# Altium footprint library SparkFun.PCBLIB: 674 footprints (part 30 of 44)
Each footprint in its own frame and in the unit in brackets; x right, y up, seen from the top. Pads: shape width x height; smd on the part's side, far side on the other; paste and mask are expansions set on the pad; w line width, h text height; cw(c..) or ccw(c..) is an arc to the next point about the centre after c.
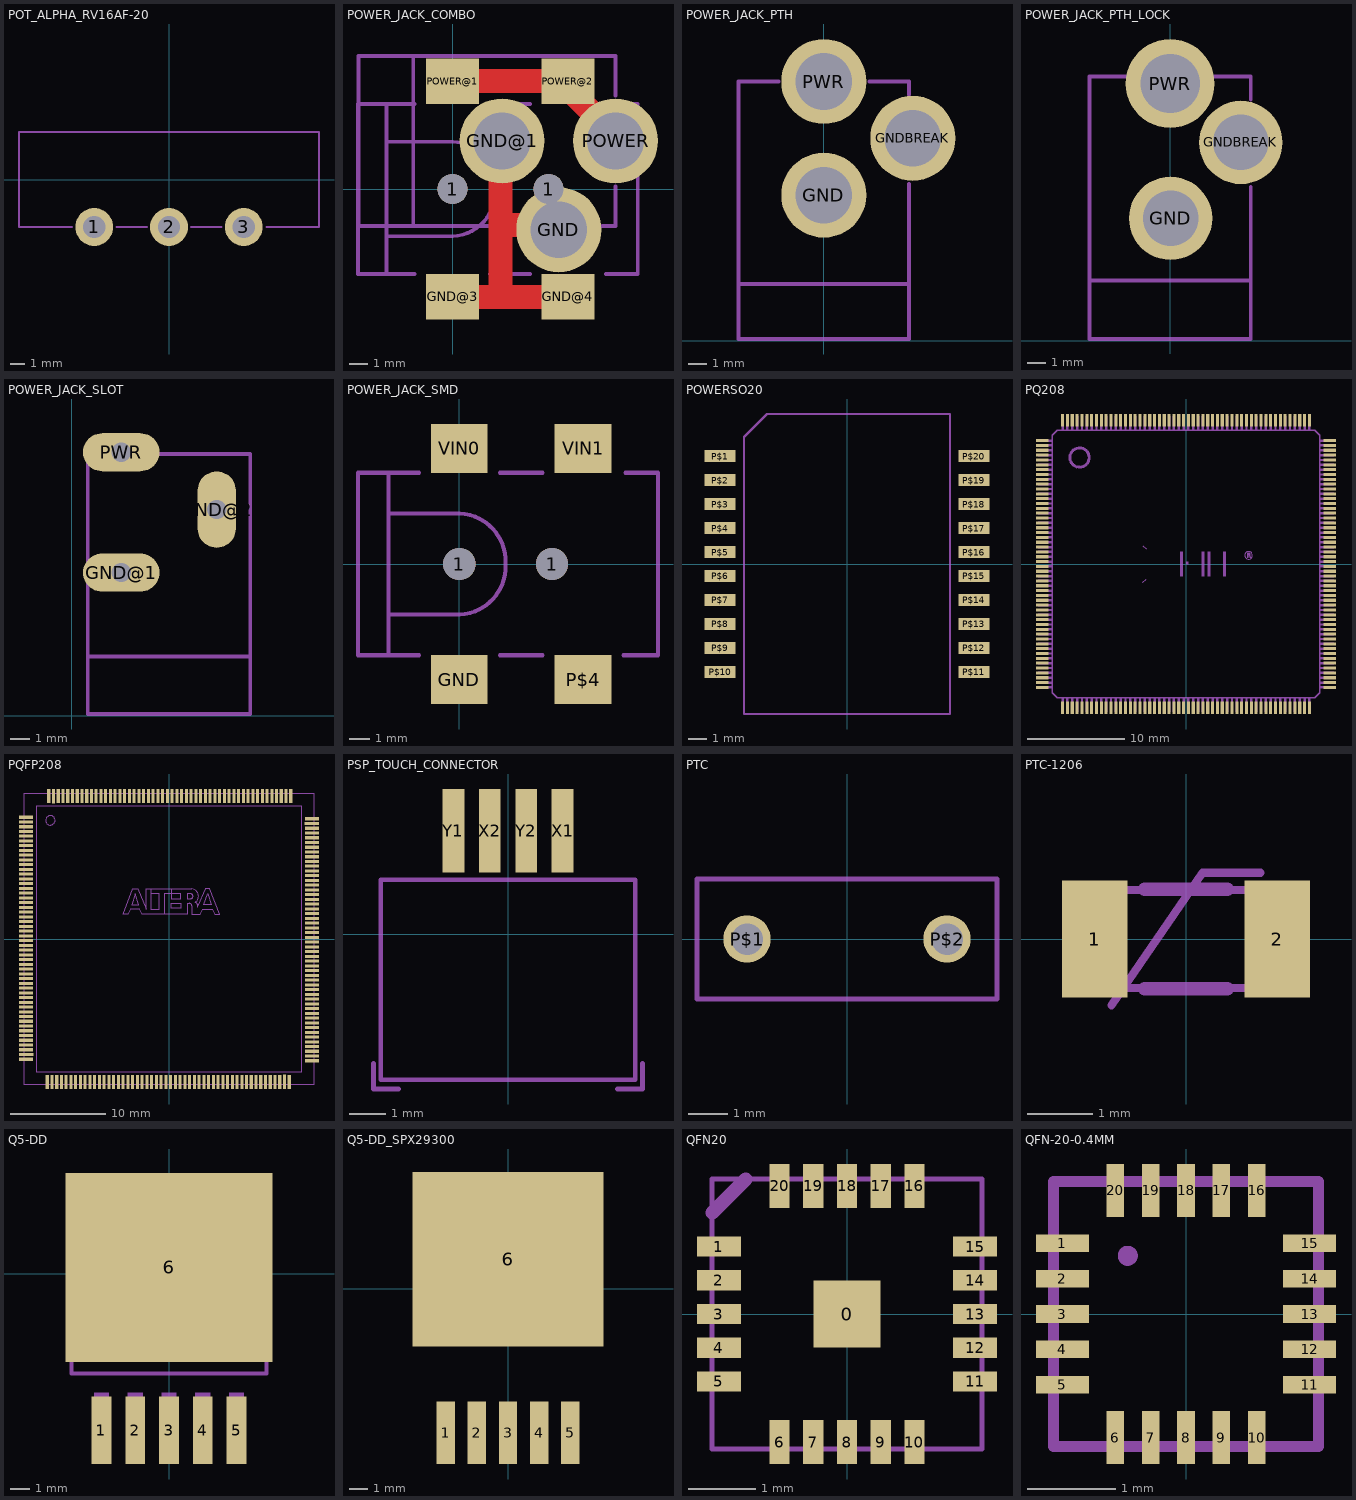
[diagram p29: the footprints below, top view; thin cyan lines are the x and y axes]

## POT_ALPHA_RV16AF-20 [mm]
pads (3):
  round 2.54 hole 1.5: 1(-5,-3.175) 2(0,-3.175) 3(5,-3.175)
Mechanical 2:
  lines w0.127: -6.477,-3.175 -10.033,-3.175 -10.033,3.175 10.033,3.175 10.033,-3.175 6.528,-3.175 ; -3.531,-3.175 -1.473,-3.175 ; 1.473,-3.175 3.531,-3.175

## POWER_JACK_COMBO [mil]
pads (9):
  round 62.99 hole 62.99: 1(0,0) 1(200,0)
  round 177 hole 118: GND(221.26,-85.04) GND@1(103.15,100) POWER(339.37,100)
  rect 110.24x94.49 smd: GND@3(0,-224.41) GND@4(240.16,-224.41) POWER@1(0,224.41) POWER@2(240.16,224.41)
Top Layer:
  lines w50: 0,-225 100,-225 ; 0,225 250,225 250,200 350,100 ; 100,100 100,-75 ; 225,-75 100,-75 ; 250,-225 100,-225 ; 100,-225 100,-75
Mechanical 18:
  lines w8: -78.74,-177.17 -137.8,-177.17 ; -78.74,177.17 -137.8,177.17 ; 78.74,-177.17 161.42,-177.17 ; 78.74,177.17 161.42,177.17 ; 126.77,-77.17 -81.89,-77.17 ; 311.81,-77.17 339.37,-77.17 339.37,5.51 ; 318.9,-177.17 385.83,-177.17 385.83,177.17 322.83,177.17 ; 339.37,194.49 339.37,277.17 -81.89,277.17 ; -137.8,-177.17 -196.85,-177.17 -196.85,177.17 -137.8,177.17 ; -137.8,-177.17 -137.8,-98.43 ; -137.8,-98.43 -137.8,98.43 ; -137.8,-98.43 0,-98.43 ccw(c-4.21,-4.21) 90,0 ccw(c-4.21,4.21) 0,98.43 -137.8,98.43 ; -137.8,98.43 -137.8,177.17 ; -81.89,-77.17 -196.06,-77.17 -196.06,277.17 -81.89,277.17 ; -81.89,-77.17 -81.89,277.17

## POWER_JACK_PTH [mil]
pads (3):
  round 177 hole 118: GND(0,303.15) GNDBREAK(185.04,421.26) PWR(0,539.37)
Mechanical 2:
  lines w8: -94.49,539.37 -177.17,539.37 -177.17,118.11 177.17,118.11 177.17,326.77 ; 94.49,539.37 177.17,539.37 177.17,511.81
Mechanical 18:
  lines w8: -177.17,118.11 -177.17,3.94 177.17,3.94 177.17,118.11

## POWER_JACK_PTH_LOCK [mil]
pads (3):
  round 177 hole 118: GND(1,260.15) GNDBREAK(150.09,421.26)
  round 188.97 hole 125.98: PWR(0,546.37)
Mechanical 2:
  lines w8: -94.49,561.37 -171.17,561.37 -171.17,128.11 171.17,128.11 171.17,326.77 ; 94.49,561.37 171.17,561.37 171.17,511.81
Mechanical 18:
  region: 58,528 58,546 -57,546 -57,528
  region: 48,291 48,302 -48,302 -48,291
  region: 187,469 176,469 176,373 187,373
  lines w8: -171.17,129.11 -171.17,3.94 171.17,3.94 171.17,129.11

## POWER_JACK_SLOT [mm]
pads (3):
  oval 4x2 hole 1: GND@1(2.58,7.5) PWR(2.58,13.8)
  oval 2x4 hole 1: GND@2(7.58,10.8)
Mechanical 2:
  lines w0.203: 0.83,6.51 0.83,3.1 9.33,3.1 ; 0.83,8.4 0.83,12.7 ; 4.83,13.7 9.33,13.7 9.33,3.1 ; 9.28,3.1 9.33,3.1
Mechanical 13:
  lines w0: 0.98,13.8 4.18,13.8 ; 0.98,13.8 cw(c1.48,13.8) 1.48,14.3 3.68,14.3 cw(c3.68,13.8) 4.18,13.8 ; 0.98,13.8 ccw(c1.48,13.8) 1.48,13.3 3.68,13.3 ccw(c3.68,13.8) 4.18,13.8 ; 0.98,7.5 cw(c1.48,7.5) 1.48,8 3.68,8 cw(c3.68,7.5) 4.18,7.5 cw(c3.68,7.5) 3.68,7 1.48,7 cw(c1.48,7.5) 0.98,7.5 ; 7.08,9.7 ccw(c7.58,9.7) 7.58,9.2 ccw(c7.58,9.7) 8.08,9.7 8.08,11.9 ccw(c7.58,11.9) 7.58,12.4 ccw(c7.58,11.9) 7.08,11.9 7.08,9.7
Mechanical 18:
  lines w0.203: 0.83,3.1 0.83,0.1 9.33,0.1 9.33,3.1 ; 0.83,6.55 0.83,8.4 ; 0.83,12.7 0.83,13.7 4.83,13.7

## POWER_JACK_SMD [mm]
pads (6):
  round 1.6 hole 1.6: 1(0,0) 1(4.572,0)
  rect 2.8x2.4 smd: GND(0,-5.7) P$4(6.1,-5.7) VIN0(0,5.7) VIN1(6.1,5.7)
Mechanical 2:
  lines w0.203: -2,-4.5 -3.5,-4.5 -3.5,-2.5 ; -2,4.5 -3.5,4.5 -3.5,2.5 ; 2,-4.5 4.1,-4.5 ; 2,4.5 4.1,4.5 ; 8.1,-4.5 9.8,-4.5 9.8,4.5 8.2,4.5 ; -3.5,-2.5 -3.5,2.5 ; -3.5,-2.5 0,-2.5 ccw(c-0.107,-0.107) 2.286,0 ccw(c-0.107,0.107) 0,2.5 -3.5,2.5
Mechanical 18:
  lines w0.203: -3.5,-4.5 -5,-4.5 -5,4.5 -3.5,4.5

## POWERSO20 [mil]
pads (20):
  rect 65x25 smd: P$1(-265,225) P$2(-265,175) P$3(-265,125) P$4(-265,75) P$5(-265,25) P$6(-265,-25) P$7(-265,-75) P$8(-265,-125) P$9(-265,-175) P$10(-265,-225) P$11(265,-225) P$12(265,-175) P$13(265,-125) P$14(265,-75) P$15(265,-25) P$16(265,25) P$17(265,75) P$18(265,125) P$19(265,175) P$20(265,225)
Mechanical 2:
  lines w5: -215,-313 215,-313 215,313 -167,313 -215,265 -215,-313

## PQ208 [mil]
pads (208):
  rect 51.18x12.6 smd paste-25.59: 1(-584.65,501.97) 2(-584.65,482.28) 3(-584.65,462.6) 4(-584.65,442.91) 5(-584.65,423.23) 6(-584.65,403.54) 7(-584.65,383.86) 8(-584.65,364.17) 9(-584.65,344.49) 10(-584.65,324.8) 11(-584.65,305.12) 12(-584.65,285.43) 13(-584.65,265.75) 14(-584.65,246.06) 15(-584.65,226.38) 16(-584.65,206.69) 17(-584.65,187.01) 18(-584.65,167.32) 19(-584.65,147.64) 20(-584.65,127.95) 21(-584.65,108.27) 22(-584.65,88.58) 23(-584.65,68.9) 24(-584.65,49.21) 25(-584.65,29.53) 26(-584.65,9.84) 27(-584.65,-9.84) 28(-584.65,-29.53) 29(-584.65,-49.21) 30(-584.65,-68.9) 31(-584.65,-88.58) 32(-584.65,-108.27) 33(-584.65,-127.95) 34(-584.65,-147.64) 35(-584.65,-167.32) 36(-584.65,-187.01) 37(-584.65,-206.69) 38(-584.65,-226.38) 39(-584.65,-246.06) 40(-584.65,-265.75) 41(-584.65,-285.43) 42(-584.65,-305.12) 43(-584.65,-324.8) 44(-584.65,-344.49) 45(-584.65,-364.17) 46(-584.65,-383.86) 47(-584.65,-403.54) 48(-584.65,-423.23) 49(-584.65,-442.91) 50(-584.65,-462.6) 51(-584.65,-482.28) 52(-584.65,-501.97) 105(584.65,-501.97) 106(584.65,-482.28) 107(584.65,-462.6) 108(584.65,-442.91) 109(584.65,-423.23) 110(584.65,-403.54) 111(584.65,-383.86) 112(584.65,-364.17) 113(584.65,-344.49) 114(584.65,-324.8) 115(584.65,-305.12) 116(584.65,-285.43) 117(584.65,-265.75) 118(584.65,-246.06) 119(584.65,-226.38) 120(584.65,-206.69) 121(584.65,-187.01) 122(584.65,-167.32) 123(584.65,-147.64) 124(584.65,-127.95) 125(584.65,-108.27) 126(584.65,-88.58) 127(584.65,-68.9) 128(584.65,-49.21) 129(584.65,-29.53) 130(584.65,-9.84) 131(584.65,9.84) 132(584.65,29.53) 133(584.65,49.21) 134(584.65,68.9) 135(584.65,88.58) 136(584.65,108.27) 137(584.65,127.95) 138(584.65,147.64) 139(584.65,167.32) 140(584.65,187.01) 141(584.65,206.69) 142(584.65,226.38) 143(584.65,246.06) 144(584.65,265.75) 145(584.65,285.43) 146(584.65,305.12) 147(584.65,324.8) 148(584.65,344.49) 149(584.65,364.17) 150(584.65,383.86) 151(584.65,403.54) 152(584.65,423.23) 153(584.65,442.91) 154(584.65,462.6) 155(584.65,482.28) 156(584.65,501.97)
  rect 12.6x51.18 smd paste-25.59: 53(-501.97,-584.65) 54(-482.28,-584.65) 55(-462.6,-584.65) 56(-442.91,-584.65) 57(-423.23,-584.65) 58(-403.54,-584.65) 59(-383.86,-584.65) 60(-364.17,-584.65) 61(-344.49,-584.65) 62(-324.8,-584.65) 63(-305.12,-584.65) 64(-285.43,-584.65) 65(-265.75,-584.65) 66(-246.06,-584.65) 67(-226.38,-584.65) 68(-206.69,-584.65) 69(-187.01,-584.65) 70(-167.32,-584.65) 71(-147.64,-584.65) 72(-127.95,-584.65) 73(-108.27,-584.65) 74(-88.58,-584.65) 75(-68.9,-584.65) 76(-49.21,-584.65) 77(-29.53,-584.65) 78(-9.84,-584.65) 79(9.84,-584.65) 80(29.53,-584.65) 81(49.21,-584.65) 82(68.9,-584.65) 83(88.58,-584.65) 84(108.27,-584.65) 85(127.95,-584.65) 86(147.64,-584.65) 87(167.32,-584.65) 88(187.01,-584.65) 89(206.69,-584.65) 90(226.38,-584.65) 91(246.06,-584.65) 92(265.75,-584.65) 93(285.43,-584.65) 94(305.12,-584.65) 95(324.8,-584.65) 96(344.49,-584.65) 97(364.17,-584.65) 98(383.86,-584.65) 99(403.54,-584.65) 100(423.23,-584.65) 101(442.91,-584.65) 102(462.6,-584.65) 103(482.28,-584.65) 104(501.97,-584.65) 157(501.97,584.65) 158(482.28,584.65) 159(462.6,584.65) 160(442.91,584.65) 161(423.23,584.65) 162(403.54,584.65) 163(383.86,584.65) 164(364.17,584.65) 165(344.49,584.65) 166(324.8,584.65) 167(305.12,584.65) 168(285.43,584.65) 169(265.75,584.65) 170(246.06,584.65) 171(226.38,584.65) 172(206.69,584.65) 173(187.01,584.65) 174(167.32,584.65) 175(147.64,584.65) 176(127.95,584.65) 177(108.27,584.65) 178(88.58,584.65) 179(68.9,584.65) 180(49.21,584.65) 181(29.53,584.65) 182(9.84,584.65) 183(-9.84,584.65) 184(-29.53,584.65) 185(-49.21,584.65) 186(-68.9,584.65) 187(-88.58,584.65) 188(-108.27,584.65) 189(-127.95,584.65) 190(-147.64,584.65) 191(-167.32,584.65) 192(-187.01,584.65) 193(-206.69,584.65) 194(-226.38,584.65) 195(-246.06,584.65) 196(-265.75,584.65) 197(-285.43,584.65) 198(-305.12,584.65) 199(-324.8,584.65) 200(-344.49,584.65) 201(-364.17,584.65) 202(-383.86,584.65) 203(-403.54,584.65) 204(-423.23,584.65) 205(-442.91,584.65) 206(-462.6,584.65) 207(-482.28,584.65) 208(-501.97,584.65)
Top Paste:
  drawing of 208 lines, arcs and shapes, not listed
Mechanical 2:
  circle w12: c-433.07,433.07 r39.37
  circle w3.94: c254.59,35.3 r15.53
  rectangle: -25,-50 -12.5,50
  rectangle: 62.5,-50 75,50
  rectangle: 87.5,-50 100,50
  rectangle: 150,-50 162.5,50
  rectangle: 249,27 252,44
  rectangle: 251,42 258,44
  rectangle: 251,34 259,37
  region: 0,0 10,0 10,10 0,10
  region: 0,0 10,0 10,10 0,10
  region: 0,0 10,0 10,10 0,10
  region: 0,0 10,0 10,10 0,10
  region: 0,0 10,0 10,10 0,10
  region: 0,0 10,0 10,10 0,10
  region: 0,0 10,0 10,10 0,10
  region: 0,0 10,0 10,10 0,10
  region: 0,0 10,0 10,10 0,10
  region: 0,0 10,0 10,10 0,10
  lines w1.27: 256.11,37.06 ccw(c256.05,39.42) 255.99,41.78 252.43,41.78 252.43,37.08 256.11,37.08 ; 261.57,33.02 262.72,27.3 258.65,27.3 257.89,32.63 ccw(c256.25,32.5) 256.37,34.16 252.43,34.28 252.43,27.3 248.75,27.3 248.75,44.57 256.75,44.57 cw(c256.81,40.02) 258.53,35.8 cw(c258.18,32.37) 261.58,33.02
  lines w2.5: -175,-75 -162.5,-62.5 ; -175,75 -162.5,62.5
  lines w6: 544.09,520.87 544.09,514.96 ; 544.09,514.96 544.09,-524.41 524.41,-544.09 -524.41,-544.09 -544.09,-524.41 -544.09,524.41 -524.41,544.09 524.41,544.09 544.09,524.41 544.09,514.96
Mechanical 18:
  drawing of 208 lines, arcs and shapes, not listed

## PQFP208 [mm]
pads (208):
  rect 1.5x0.33 smd paste-0.75: 1(-15.05,12.83) 2(-15.05,12.33) 3(-15.05,11.83) 4(-15.05,11.33) 5(-15.05,10.83) 6(-15.05,10.33) 7(-15.05,9.83) 8(-15.05,9.33) 9(-15.05,8.83) 10(-15.05,8.33) 11(-15.05,7.83) 12(-15.05,7.33) 13(-15.05,6.83) 14(-15.05,6.33) 15(-15.05,5.83) 16(-15.05,5.33) 17(-15.05,4.83) 18(-15.05,4.33) 19(-15.05,3.83) 20(-15.05,3.33) 21(-15.05,2.83) 22(-15.05,2.33) 23(-15.05,1.83) 24(-15.05,1.33) 25(-15.05,0.83) 26(-15.05,0.33) 27(-15.05,-0.17) 28(-15.05,-0.67) 29(-15.05,-1.17) 30(-15.05,-1.67) 31(-15.05,-2.17) 32(-15.05,-2.67) 33(-15.05,-3.17) 34(-15.05,-3.67) 35(-15.05,-4.17) 36(-15.05,-4.67) 37(-15.05,-5.17) 38(-15.05,-5.67) 39(-15.05,-6.17) 40(-15.05,-6.67) 41(-15.05,-7.17) 42(-15.05,-7.67) 43(-15.05,-8.17) 44(-15.05,-8.67) 45(-15.05,-9.17) 46(-15.05,-9.67) 47(-15.05,-10.17) 48(-15.05,-10.67) 49(-15.05,-11.17) 50(-15.05,-11.67) 51(-15.04,-12.17) 52(-15.05,-12.67) 105(15.05,-12.83) 106(15.05,-12.33) 107(15.05,-11.83) 108(15.05,-11.33) 109(15.05,-10.83) 110(15.05,-10.33) 111(15.05,-9.83) 112(15.05,-9.33) 113(15.05,-8.83) 114(15.05,-8.33) 115(15.05,-7.83) 116(15.05,-7.33) 117(15.05,-6.83) 118(15.05,-6.33) 119(15.05,-5.83) 120(15.05,-5.33) 121(15.05,-4.83) 122(15.05,-4.33) 123(15.05,-3.83) 124(15.05,-3.33) 125(15.05,-2.83) 126(15.05,-2.33) 127(15.05,-1.83) 128(15.05,-1.33) 129(15.05,-0.83) 130(15.05,-0.33) 131(15.05,0.17) 132(15.05,0.67) 133(15.05,1.17) 134(15.05,1.67) 135(15.05,2.17) 136(15.05,2.67) 137(15.05,3.17) 138(15.05,3.67) 139(15.05,4.17) 140(15.05,4.67) 141(15.05,5.17) 142(15.05,5.67) 143(15.05,6.17) 144(15.05,6.67) 145(15.05,7.17) 146(15.05,7.67) 147(15.05,8.17) 148(15.05,8.67) 149(15.05,9.17) 150(15.05,9.67) 151(15.05,10.17) 152(15.05,10.67) 153(15.05,11.17) 154(15.05,11.67) 155(15.04,12.17) 156(15.05,12.67)
  rect 0.33x1.5 smd paste-0.75: 53(-12.83,-15.05) 54(-12.33,-15.05) 55(-11.83,-15.05) 56(-11.33,-15.05) 57(-10.83,-15.05) 58(-10.33,-15.05) 59(-9.83,-15.05) 60(-9.33,-15.05) 61(-8.83,-15.05) 62(-8.33,-15.05) 63(-7.83,-15.05) 64(-7.33,-15.05) 65(-6.83,-15.05) 66(-6.33,-15.05) 67(-5.83,-15.05) 68(-5.33,-15.05) 69(-4.83,-15.05) 70(-4.33,-15.05) 71(-3.83,-15.05) 72(-3.33,-15.05) 73(-2.83,-15.05) 74(-2.33,-15.05) 75(-1.83,-15.05) 76(-1.33,-15.05) 77(-0.83,-15.05) 78(-0.33,-15.05) 79(0.17,-15.05) 80(0.67,-15.05) 81(1.17,-15.05) 82(1.67,-15.05) 83(2.17,-15.05) 84(2.67,-15.05) 85(3.17,-15.05) 86(3.67,-15.05) 87(4.17,-15.05) 88(4.67,-15.05) 89(5.17,-15.05) 90(5.67,-15.05) 91(6.17,-15.05) 92(6.67,-15.05) 93(7.17,-15.05) 94(7.67,-15.05) 95(8.17,-15.05) 96(8.67,-15.05) 97(9.17,-15.05) 98(9.67,-15.05) 99(10.17,-15.05) 100(10.67,-15.05) 101(11.17,-15.05) 102(11.67,-15.05) 103(12.17,-15.04) 104(12.67,-15.05) 157(12.83,15.05) 158(12.33,15.05) 159(11.83,15.05) 160(11.33,15.05) 161(10.83,15.05) 162(10.33,15.05) 163(9.83,15.05) 164(9.33,15.05) 165(8.83,15.05) 166(8.33,15.05) 167(7.83,15.05) 168(7.33,15.05) 169(6.83,15.05) 170(6.33,15.05) 171(5.83,15.05) 172(5.33,15.05) 173(4.83,15.05) 174(4.33,15.05) 175(3.83,15.05) 176(3.33,15.05) 177(2.83,15.05) 178(2.33,15.05) 179(1.83,15.05) 180(1.33,15.05) 181(0.83,15.05) 182(0.33,15.05) 183(-0.17,15.05) 184(-0.67,15.05) 185(-1.17,15.05) 186(-1.67,15.05) 187(-2.17,15.05) 188(-2.67,15.05) 189(-3.17,15.05) 190(-3.67,15.05) 191(-4.17,15.05) 192(-4.67,15.05) 193(-5.17,15.05) 194(-5.67,15.05) 195(-6.17,15.05) 196(-6.67,15.05) 197(-7.17,15.05) 198(-7.67,15.05) 199(-8.17,15.05) 200(-8.67,15.05) 201(-9.17,15.05) 202(-9.67,15.05) 203(-10.17,15.05) 204(-10.67,15.05) 205(-11.17,15.05) 206(-11.67,15.05) 207(-12.168,15.049) 208(-12.67,15.05)
Top Paste:
  drawing of 208 lines, arcs and shapes, not listed
Mechanical 2:
  circle w0.127: c-12.5,12.5 r0.5
  lines w0.127: -0.389,2.603 1.897,2.603 1.897,3.746 2.151,3.746 cw(c2.151,3.492) 2.405,3.492 2.405,2.603 3.294,2.603 3.548,3.111 4.564,3.111 4.818,2.603 5.326,2.603 4.31,5.27 3.802,5.27 3.04,3.492 ; 2.786,3.872 ccw(c2.342,4.502) 2.405,5.27 0.246,5.27 ; 2.786,3.873 cw(c2.596,3.461) 3.04,3.365 ; -1.913,4.762 -1.913,5.27 ; -1.913,4.762 -1.913,3.111 -1.024,3.111 -1.024,4.762 -1.913,4.762 ; -1.913,5.27 -2.421,5.27 -2.421,3.111 -3.31,5.27 -3.818,5.27 -4.834,2.603 -4.326,2.603 -4.072,3.111 -3.056,3.111 -2.802,2.603 -0.516,2.603 -0.516,4.762 0.246,4.762 ; -1.913,5.27 0.246,5.27 ; 0.246,4.762 0.246,5.27 ; 0.246,4.762 0.246,4.254 1.262,4.254 1.262,4.762 0.246,4.762 ; -14,-14 14,-14 14,14 -14,14 -14,-14 ; -3.945,3.619 -3.564,4.762 -3.183,3.619 -3.945,3.619 ; 0.246,3.238 1.262,3.238 1.262,3.746 0.246,3.746 0.246,3.238 ; 1.897,4.254 1.897,4.762 2.278,4.762 cw(c2.278,4.508) 2.278,4.254 1.897,4.254 ; 3.675,3.619 4.437,3.619 4.056,4.762 3.675,3.619
Mechanical 18:
  lines w0.127: -15.3,-15.3 15.3,-15.3 15.3,15.29 -15.3,15.29 -15.3,-15.3

## PSP_TOUCH_CONNECTOR [mil]
pads (4):
  rect 23.62x90.55 smd: X1(59.06,112.2) X2(-19.69,112.2) Y1(-59.06,112.2) Y2(19.69,112.2)
Mechanical 2:
  lines w5: -145.67,-139.76 -145.67,-167.32 -118.11,-167.32 ; 118.11,-167.32 145.67,-167.32 145.67,-139.76
Mechanical 18:
  lines w5: -137.8,-157.48 137.8,-157.48 137.8,59.06 -137.8,59.06 -137.8,-157.48

## PTC [mil]
pads (2):
  round 47.25 hole 31.5: P$1(-100,0) P$2(100,0)
Mechanical 2:
  lines w5: -150,-60 150,-60 150,60 -150,60 -150,-60

## PTC-1206 [mm]
pads (2):
  rect 1x1.8 smd: 1(-1.4,0) 2(1.4,0)
Mechanical 2:
  lines w0.203: -0.635,-0.762 0.635,-0.762 ; -0.635,0.762 0.635,0.762
Mechanical 18:
  lines w0.127: -1.143,-1.016 0.254,1.016 1.143,1.016 ; -1.5,-0.75 1.5,-0.75 1.5,0.75 -1.5,0.75 -1.5,-0.75

## Q5-DD [mm]
pads (6):
  rect 1x3.4 smd: 1(-3.4,-7.875) 2(-1.7,-7.875) 3(0,-7.875) 4(1.7,-7.875) 5(3.4,-7.875)
  rect 10.414x9.525 smd: 6(0,0.325)
Mechanical 18:
  circle w0.254: c0,-0.175 r1
  rectangle: -0.381,-8.768 0.381,-5.974
  rectangle: -3.781,-8.768 -3.019,-5.974
  rectangle: -2.081,-8.768 -1.319,-5.974
  rectangle: 1.319,-8.768 2.081,-5.974
  rectangle: 3.019,-8.768 3.781,-5.974
  region: 0,0 0.254,0 0.254,0.254 0,0.254
  lines w0.203: -4.917,-5.014 4.917,-5.014 4.917,3.99 -4.917,3.99 -4.917,-5.014

## Q5-DD_SPX29300 [mm]
pads (6):
  rect 1x3.4 smd: 1(-3.4,-7.875) 2(-1.7,-7.875) 3(0,-7.875) 4(1.7,-7.875) 5(3.4,-7.875)
  rect 10.414x9.525 smd paste-5.207: 6(0,1.595)
Top Paste:
  rectangle: -3.81,2.54 -1.27,5.08
  rectangle: 1.27,2.54 3.81,5.08
  rectangle: 1.27,-2.54 3.81,0
  rectangle: -3.81,-2.54 -1.27,0

## QFN20 [mm]
pads (21):
  rect 1x1 smd paste-0.5: 0(0,0)
  rect 0.65x0.3 smd paste-0.325: 1(-1.9,1) 2(-1.9,0.5) 3(-1.9,0) 4(-1.9,-0.5) 5(-1.9,-1) 11(1.9,-1) 12(1.9,-0.5) 13(1.9,0) 14(1.9,0.5) 15(1.9,1)
  rect 0.3x0.65 smd paste-0.325: 6(-1,-1.9) 7(-0.5,-1.9) 8(0,-1.9) 9(0.5,-1.9) 10(1,-1.9) 16(1,1.9) 17(0.5,1.9) 18(0,1.9) 19(-0.5,1.9) 20(-1,1.9)
Top Paste:
  rectangle: -0.25,-0.25 0.25,0.25
  rectangle: -2.095,0.902 -1.613,1.105
  rectangle: -2.095,0.394 -1.613,0.597
  rectangle: -2.095,-0.102 -1.613,0.102
  rectangle: -2.095,-0.597 -1.613,-0.394
  rectangle: -2.095,-1.105 -1.613,-0.902
  rectangle: 1.613,0.902 2.095,1.105
  rectangle: 1.613,0.394 2.095,0.597
  rectangle: 1.613,-0.102 2.095,0.102
  rectangle: 1.613,-0.597 2.095,-0.394
  rectangle: 1.613,-1.105 2.095,-0.902
  region: -0.902,1.613 -0.902,2.095 -1.105,2.095 -1.105,1.613
  region: -0.394,1.613 -0.394,2.095 -0.597,2.095 -0.597,1.613
  region: 0.102,1.613 0.102,2.095 -0.102,2.095 -0.102,1.613
  region: 0.597,1.613 0.597,2.095 0.394,2.095 0.394,1.613
  region: 1.105,1.613 1.105,2.095 0.902,2.095 0.902,1.613
  region: -0.902,-2.095 -0.902,-1.613 -1.105,-1.613 -1.105,-2.095
  region: -0.394,-2.095 -0.394,-1.613 -0.597,-1.613 -0.597,-2.095
  region: 0.102,-2.095 0.102,-1.613 -0.102,-1.613 -0.102,-2.095
  region: 0.597,-2.095 0.597,-1.613 0.394,-1.613 0.394,-2.095
  region: 1.105,-2.095 1.105,-1.613 0.902,-1.613 0.902,-2.095
Mechanical 2:
  lines w0.203: -2,1.5 -1.5,2
Mechanical 18:
  lines w0.076: -2,-2 2,-2 2,2 -2,2 -2,-2

## QFN-20-0.4MM [mil]
pads (20):
  rect 23.62x7.87 smd: 1(-55.12,31.5) 2(-55.12,15.75) 3(-55.12,0) 4(-55.12,-15.75) 5(-55.12,-31.5) 11(55.12,-31.5) 12(55.12,-15.75) 13(55.12,0) 14(55.12,15.75) 15(55.12,31.5)
  rect 7.87x23.62 smd: 6(-31.5,-55.12) 7(-15.75,-55.12) 8(0,-55.12) 9(15.75,-55.12) 10(31.5,-55.12) 16(31.5,55.12) 17(15.75,55.12) 18(0,55.12) 19(-15.75,55.12) 20(-31.5,55.12)
Mechanical 2:
  circle w5: c-25.98,25.98 r1.97
  lines w5: -59.06,-39.37 -59.06,-59.06 -39.37,-59.06 ; -59.06,39.37 -59.06,59.06 -39.37,59.06 ; 39.37,-59.06 59.06,-59.06 59.06,-39.37 ; 39.37,59.06 59.06,59.06 59.06,39.37
Mechanical 18:
  lines w5: -59.06,-59.06 -59.06,59.06 59.06,59.06 59.06,-59.06 -59.06,-59.06